# Altium footprint library myLibraryAltium.PcbLib: 215 footprints (part 1 of 14)
Each footprint in its own frame and in the unit in brackets; x right, y up, seen from the top. Pads: shape width x height; smd on the part's side, far side on the other; paste and mask are expansions set on the pad; w line width, h text height; cw(c..) or ccw(c..) is an arc to the next point about the centre after c.
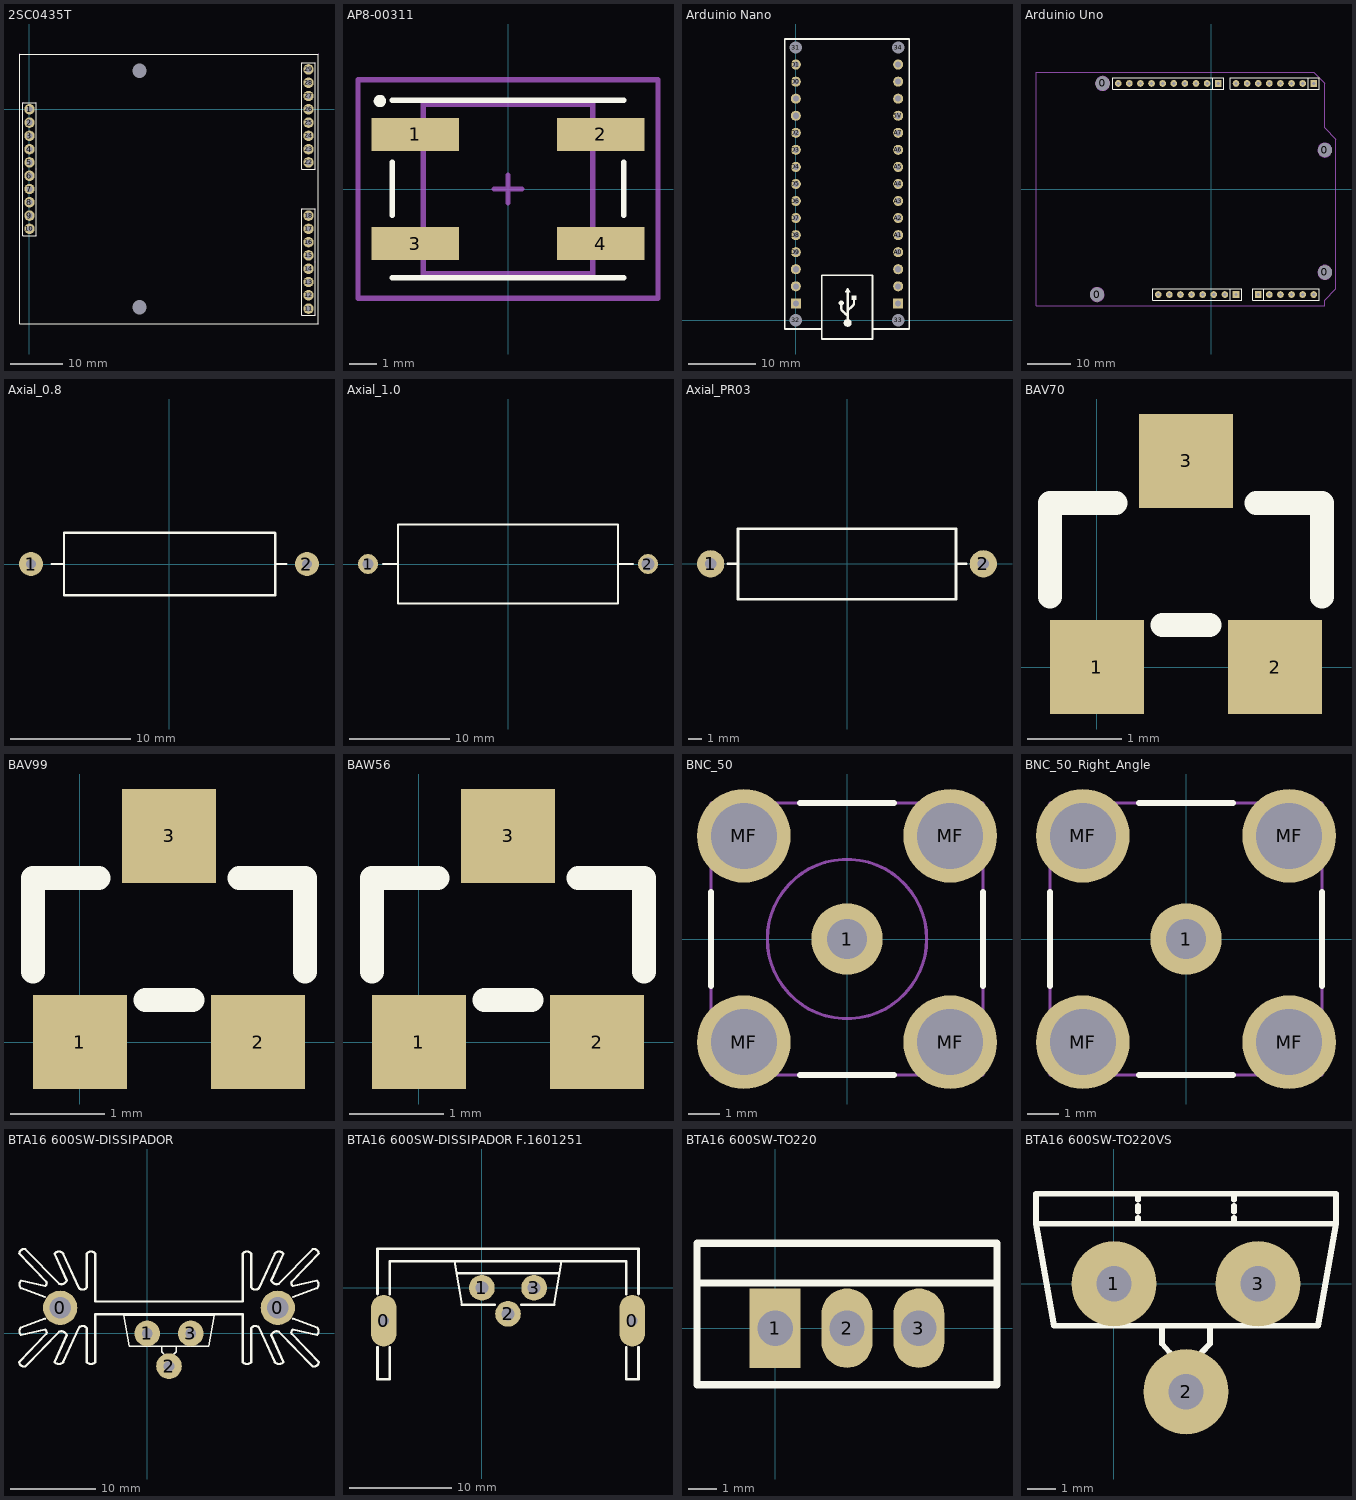
[diagram p0: the footprints below, top view; thin cyan lines are the x and y axes]

## 2SC0435T [mil] "Power Integration Core"
height 43.31
pads (66):
  round 8 on Mech4: 1(-75,-1615) 1(-75,-1615) 1(-75,415) 1(-75,415) 1(2175,-1615) 1(2175,-1615) 1(2175,415) 1(2175,415)
  round 8 on Mech6: 1(-50,-950) 1(-50,-950) 1(-50,-450) 1(-50,-450) 1(-50,50) 1(-50,50) 1(50,-950) 1(50,-950) 1(50,-450) 1(50,-450) 1(50,50) 1(50,50) 1(2050,-1550) 1(2050,-1550) 1(2050,-750) 1(2050,-750) 1(2050,-450) 1(2050,-450) 1(2050,350) 1(2050,350) 1(2150,-1550) 1(2150,-1550) 1(2150,-1150) 1(2150,-1150) 1(2150,-750) 1(2150,-750) 1(2150,-450) 1(2150,-450) 1(2150,350) 1(2150,350)
  round 78.74 hole 43.31: 1(0,0) 2(0,-100) 3(0,-200) 4(0,-300) 5(0,-400) 6(0,-500) 7(0,-600) 8(0,-700) 9(0,-800) 10(0,-900) 11(2100,-1500) 12(2100,-1400) 13(2100,-1300) 14(2100,-1200) 15(2100,-1100) 16(2100,-1000) 17(2100,-900) 18(2100,-800) 22(2100,-400) 23(2100,-300) 24(2100,-200) 25(2100,-100) 26(2100,0) 27(2100,100) 28(2100,200) 29(2100,300)
  round 60 hole 106.3 unplated: ""(826.77,-1490.04) ""(826.77,289.96)
Top Overlay:
  lines w8: -75,-1615 -75,415 2175,415 2175,-1615 -75,-1615 ; -50,-950 50,-950 50,-450 50,50 -50,50 -50,-450 -50,-950 ; 2050,-1550 2050,-750 2150,-750 2150,-1150 2150,-1550 2050,-1550 ; 2050,-450 2050,350 2150,350 2150,-450 2050,-450
Mechanical 4:
3D body "2SC0435T2A0_3D_v2.stp": height 777.77, standoff -83.69, extent -70.86,-1608.27 2179.14,421.73

## AP8-00311 [mm] "6.5 x 6.0 push button SMD"
height 3.5
pads (4):
  rect 3.2x1.2 smd: 1(-3.4,2) 2(3.4,2) 3(-3.4,-2) 4(3.4,-2)
Top Overlay:
  circle w0.254: c-4.697,3.226 r0.1
  lines w0.2: -4.25,-3.25 4.25,-3.25 ; -4.25,3.25 4.25,3.25 ; -4.242,-0.965 -4.242,0.991 ; 4.25,-0.965 4.25,0.991
Mechanical 13:
  lines w0.2: -3.1,-3.1 3.1,-3.1 3.1,3.1 -3.1,3.1 -3.1,-3.1
Mechanical 15:
  lines w0.2: -0.5,0 0.5,0 ; 0,-0.5 0,0.5 ; -5.5,-4 -5.5,4 -2.75,4 2.75,4 5.5,4 5.5,-4 2.75,-4 -2.75,-4 -5.5,-4
3D body: height 0, standoff 0, extent -3.1,-3.1 3.1,3.1

## Arduinio Nano [mm]
pads (34):
  round 1.5 hole 0.9: 3V3(15.24,5.08) 5V(15.24,30.48) A0(15.24,10.16) A1(15.24,12.7) A2(15.24,15.24) A3(15.24,17.78) A4(15.24,20.32) A5(15.24,22.86) A6(15.24,25.4) A7(15.24,27.94) D0(0,35.56) D1(0,38.1) D2(0,27.94) D3(0,25.4) D4(0,22.86) D5(0,20.32) D6(0,17.78) D7(0,15.24) D8(0,12.7) D9(0,10.16) D10(0,7.62) D11(0,5.08) GND(0,30.48) GND1(15.24,35.56) IOREF(15.24,7.62) RESET(0,33.02) RESET1(15.24,33.02) VIN(15.24,38.1)
  round 1.524 hole 1.85: 31(0,40.64) 32(0,0) 33(15.24,0) 34(15.24,40.64)
  rect 1.5x1.5 hole 0.9: D12(0,2.54) D13(15.24,2.54)
Top Overlay:
  drawing of 356 lines, arcs and shapes, not listed

## Arduinio Uno [mil]
pads (36):
  round 125.98 hole 125.98: 0(-1027.76,-950) 0(-977.76,950) 0(1022.24,-750) 0(1022.24,350)
  round 60 hole 30: 3V3(-177.76,-950) 5V(-77.76,-950) A1(522.24,-950) A2(622.24,-950) A3(722.24,-950) A4(822.24,-950) A5(922.24,-950) AREF(-637.76,950) D1(822.24,950) D2(722.24,950) D3(622.24,950) D4(522.24,950) D5(422.24,950) D6(322.24,950) D7(222.24,950) D9(-37.76,950) D10(-137.76,950) D11(-237.76,950) D12(-337.76,950) D13(-437.76,950) GND(22.24,-950) GND1(122.24,-950) GND2(-537.76,950) IOREF(-377.76,-950) RESET(-277.76,-950) SCL(-837.76,950) SDA(-737.76,950) ""(-477.76,-950)
  rect 60x60 hole 30: A0(422.24,-950) D0(922.24,950) D8(62.24,950) Vin(222.24,-950)
Top Overlay:
  lines w10: 172.24,-1000 172.24,-900 ; 872.24,900 872.24,1000 ; 12.24,900 112.24,900 112.24,1000 12.24,1000 ; 12.24,900 12.24,1000 ; 12.24,900 -887.76,900 -887.76,1000 12.24,1000 ; 472.24,-1000 972.24,-1000 972.24,-900 472.24,-900 ; 472.24,-1000 472.24,-900 ; 472.24,-1000 372.24,-1000 372.24,-950 372.24,-900 472.24,-900 ; -527.76,-1000 272.24,-1000 272.24,-900 -527.76,-900 -527.76,-1000 ; 172.24,900 972.24,900 972.24,1000 172.24,1000 172.24,900
Mechanical 1:
  circle w5: c-977.76,950 r62.99
  circle w5: c1022.24,-750 r62.99
  circle w5: c-1027.76,-950 r62.99
  circle w5: c1022.24,350 r62.99
Mechanical 13:
  lines w5: -1577.76,-1050 -1577.76,1050 922.24,1050 1022.24,950 1022.24,550 1122.24,450 1122.24,-900 1022.24,-1000 1022.24,-1050 -1577.76,-1050
3D body "SIL_Socket08_.stp": height 334.65, standoff -584.65, extent -527.76,-1000.01 272.24,-900.01
3D body "SIL_Socket08_.stp": height 334.65, standoff -584.65, extent 172.24,899.99 972.24,999.99
3D body "SIL_Socket10.stp": height 334.65, standoff -584.65, extent -887.76,900 112.24,1000
3D body "SIL_Socket06.stp": height 334.65, standoff -584.65, extent 372.25,-999.99 972.25,-899.99

## Axial_0.8 [mm] "Lmax = 22mm"
pads (2):
  round 2 hole 0.85: 1(-11.5,0) 2(11.5,0)
Top Overlay:
  lines w0.2: -9.775,0 -8.75,0 ; -8.75,-2.6 8.85,-2.6 8.85,2.575 8.825,2.6 -8.75,2.6 -8.75,-2.575 ; 8.925,0 9.775,0
3D body "User Library-PR03.step": height 10.6, standoff -2.5, extent -11.88,-2.5 11.78,2.7

## Axial_1.0 [mm]
pads (2):
  round 2 hole 1.1: 1(-14,0)
  round 2 hole 1.3: 2(14,0)
Top Overlay:
  lines w0.2: -12.5,0 -11,0 ; 11,0 12.5,0 ; -11,-3.96 11,-3.96 11,3.96 -11,3.96 -11,-3.96
3D body "User Library-RS005.STEP": height 8.12, standoff -2.5, extent -14.43,-4.07 14.53,3.85

## Axial_PR03 [mm] "Lmax = 20mm"
pads (2):
  round 2 hole 0.85: 1(-10,0) 2(10,0)
Top Overlay:
  lines w0.2: -8.75,0 -8.025,0 ; -8,-2.6 -8,2.575 8,2.575 8,-2.6 -7.95,-2.6 ; 7.975,0 8.725,0

## BAV70 [mm]
pads (3):
  rect 1x1 smd: 1(0,0) 2(1.9,0) 3(0.95,2.2)
Top Overlay:
  lines w0.254: -0.5,0.75 -0.5,1.75 0.2,1.75 ; 0.7,0.45 1.2,0.45 ; 1.7,1.75 2.4,1.75 2.4,0.75

## BAV99 [mm]
pads (3):
  rect 1x1 smd: 1(0,0) 2(1.9,0) 3(0.95,2.2)
Top Overlay:
  lines w0.254: -0.5,0.75 -0.5,1.75 0.2,1.75 ; 0.7,0.45 1.2,0.45 ; 1.7,1.75 2.4,1.75 2.4,0.75

## BAW56 [mm]
pads (3):
  rect 1x1 smd: 1(0,0) 2(1.9,0) 3(0.95,2.2)
Top Overlay:
  lines w0.254: -0.5,0.75 -0.5,1.75 0.2,1.75 ; 0.7,0.45 1.2,0.45 ; 1.7,1.75 2.4,1.75 2.4,0.75

## BNC_50 [mm] "RF/Coaxial Connector,Vertical Angle Jack, Through Hole"
pads (5):
  round 2.286 hole 1.27: 1(0,0)
  round 3 hole 2.11: MF(-3.3,-3.3) MF(-3.3,3.3) MF(3.3,-3.3) MF(3.3,3.3)
Top Overlay:
  lines w0.2: -4.35,-1.5 -4.35,1.5 ; -1.5,-4.35 1.5,-4.35 ; -1.5,4.35 1.5,4.35 ; 4.35,-1.5 4.35,1.5
Mechanical 13:
  circle w0.1: c0,0 r2.55
  lines w0.1: -4.35,-4.35 4.35,-4.35 4.35,4.35 -4.35,4.35 -4.35,-4.35
Mechanical 15:
  lines w0.1: -0.5,0 0.5,0 ; 0,-0.5 0,0.5
3D body: height 6.4, standoff 1.7, extent -2.545,-2.53 2.545,2.55
3D body: height 1.7, standoff 0, extent -4.35,-4.35 4.35,4.35

## BNC_50_Right_Angle [mm] "RF/Coaxial Connector,Right Angle Jack, Through Hole"
pads (5):
  round 2.286 hole 1.27: 1(0,0)
  round 3 hole 2.11: MF(-3.3,-3.3) MF(-3.3,3.3) MF(3.3,-3.3) MF(3.3,3.3)
Top Overlay:
  lines w0.2: -4.35,-1.5 -4.35,1.5 ; -1.5,-4.35 1.5,-4.35 ; -1.5,4.35 1.5,4.35 ; 4.35,-1.5 4.35,1.5
Mechanical 13:
  lines w0.1: -4.35,-4.35 -4.35,4.35 4.35,4.35 4.35,-4.35 -4.35,-4.35
Mechanical 15:
  lines w0.1: -0.5,0 0.5,0 ; 0,-0.5 0,0.5
3D body: height 1.7, standoff 0, extent -4.35,-4.35 4.35,23.4
3D body: height 3.7, standoff 1.7, extent -0.175,18.152 0.225,18.55

## BTA16 600SW-DISSIPADOR [mm]
pads (5):
  round 4 hole 2.5: 0(-10.16,3) 0(15.24,3)
  round 3 hole 1.25: 1(0,0) 2(2.54,-3.81) 3(5.08,0)
Top Overlay:
  lines w0.2: 1.693,-1.482 1.693,-2.117 1.957,-2.416 ; 3.099,-2.416 3.387,-2.117 3.387,-1.482 ; -2.752,2.117 7.832,2.117 7.197,-1.482 -2.117,-1.482 -2.752,2.117
  lines w0.254: -11.938,1.73 -14.732,0.714 ccw(c-14.287,0.269) -14.732,-0.175 -11.938,0.46 cw(c-12.116,0.129) -11.785,-0.048 -14.96,-3.35 ccw(c-14.347,-3.235) -14.232,-3.848 -10.287,0.206 cw(c-10.033,-0.429) -9.398,-0.175 -10.81,-3.35 ccw(c-10.31,-2.85) -9.81,-3.35 -7.962,0.714 cw(c-7.543,0.231) -7.06,0.65 -7.06,-3.35 ccw(c-6.56,-2.85) -6.06,-3.35 -6.06,2.25 11.14,2.25 11.14,-3.35 ccw(c11.64,-2.85) 12.14,-3.35 12.14,0.65 cw(c12.623,0.231) 13.042,0.714 14.89,-3.35 ccw(c15.39,-2.85) 15.89,-3.35 14.478,-0.175 cw(c15.113,-0.429) 15.367,0.206 19.312,-3.848 ccw(c19.427,-3.235) 20.04,-3.35 16.865,-0.048 cw(c17.196,0.129) 17.018,0.46 19.812,-0.175 ccw(c19.367,0.269) 19.812,0.714 17.018,1.73 ; -11.938,4.27 -14.732,5.286 cw(c-14.287,5.73) -14.732,6.175 -11.938,5.54 ccw(c-12.116,5.87) -11.785,6.048 -14.96,9.35 cw(c-14.347,9.235) -14.232,9.848 -10.287,5.794 ccw(c-10.033,6.429) -9.398,6.175 -10.81,9.35 cw(c-10.31,8.85) -9.81,9.35 -7.962,5.286 ccw(c-7.543,5.769) -7.06,5.35 -7.06,9.35 cw(c-6.56,8.85) -6.06,9.35 -6.06,3.75 11.14,3.75 11.14,9.35 cw(c11.64,8.85) 12.14,9.35 12.14,5.35 ccw(c12.623,5.769) 13.042,5.286 14.89,9.35 cw(c15.39,8.85) 15.89,9.35 14.478,6.175 ccw(c15.113,6.429) 15.367,5.794 19.312,9.848 cw(c19.427,9.235) 20.04,9.35 16.865,6.048 ccw(c17.196,5.87) 17.018,5.54 19.812,6.175 cw(c19.367,5.73) 19.812,5.286 17.018,4.27

## BTA16 600SW-DISSIPADOR F.1601251 [mm]
pads (5):
  oval 2.5x5 hole 1: 0(-9.56,-3.2) 0(14.64,-3.2)
  round 2.5 hole 1.25: 1(0,0) 2(2.54,-2.54) 3(5.08,0)
Top Overlay:
  lines w0.2: 1.29,-1.65 -1.96,-1.65 -2.66,2.6 7.74,2.6 7.04,-1.65 3.79,-1.65
  lines w0.254: -10.16,-5.8 -10.16,-8.9 -8.96,-8.9 -8.96,-5.8 ; -10.16,-0.6 -10.16,3.8 15.24,3.8 15.24,-0.6 ; -8.96,-0.6 -8.96,2.6 14.04,2.6 14.04,-0.6 ; -2.41,1.4 7.49,1.4 ; 14.04,-5.8 14.04,-8.9 15.24,-8.9 15.24,-5.8
Mechanical 1:
  lines w1.5: -9.56,-4.47 -9.56,-1.93 ; 14.64,-4.47 14.64,-1.93

## BTA16 600SW-TO220 [mm]
pads (3):
  rect 1.8x2.8 hole 1.25: 1(0,0)
  oval 1.8x2.8 hole 1.25: 2(2.54,0) 3(5.08,0)
Top Overlay:
  lines w0.254: -2.76,1.6 7.84,1.6 ; -2.76,-2 -2.76,3 7.84,3 7.84,-2 -2.76,-2

## BTA16 600SW-TO220VS [mm]
pads (3):
  round 3 hole 1.25: 1(0,0) 2(2.54,-3.81) 3(5.08,0)
Top Overlay:
  lines w0.2: 0.847,2.117 0.847,2.328 ; 0.847,2.54 0.847,2.752 ; 0.847,2.963 0.847,3.175 ; 1.693,-1.482 1.693,-2.117 1.957,-2.416 ; 3.099,-2.416 3.387,-2.117 3.387,-1.482 ; 4.233,2.117 4.233,2.328 ; 4.233,2.54 4.233,2.752 ; 4.233,2.963 4.233,3.175 ; -2.752,2.117 -2.752,3.175 7.832,3.175 7.832,2.117 ; -2.752,2.117 -2.117,-1.482 7.197,-1.482 7.832,2.117 ; -2.752,2.117 7.832,2.117